# Altium footprint library pw.PcbLib: 210 footprints (part 9 of 14)
Each footprint in its own frame and in the unit in brackets; x right, y up, seen from the top. Pads: shape width x height; smd on the part's side, far side on the other; paste and mask are expansions set on the pad; w line width, h text height; cw(c..) or ccw(c..) is an arc to the next point about the centre after c.
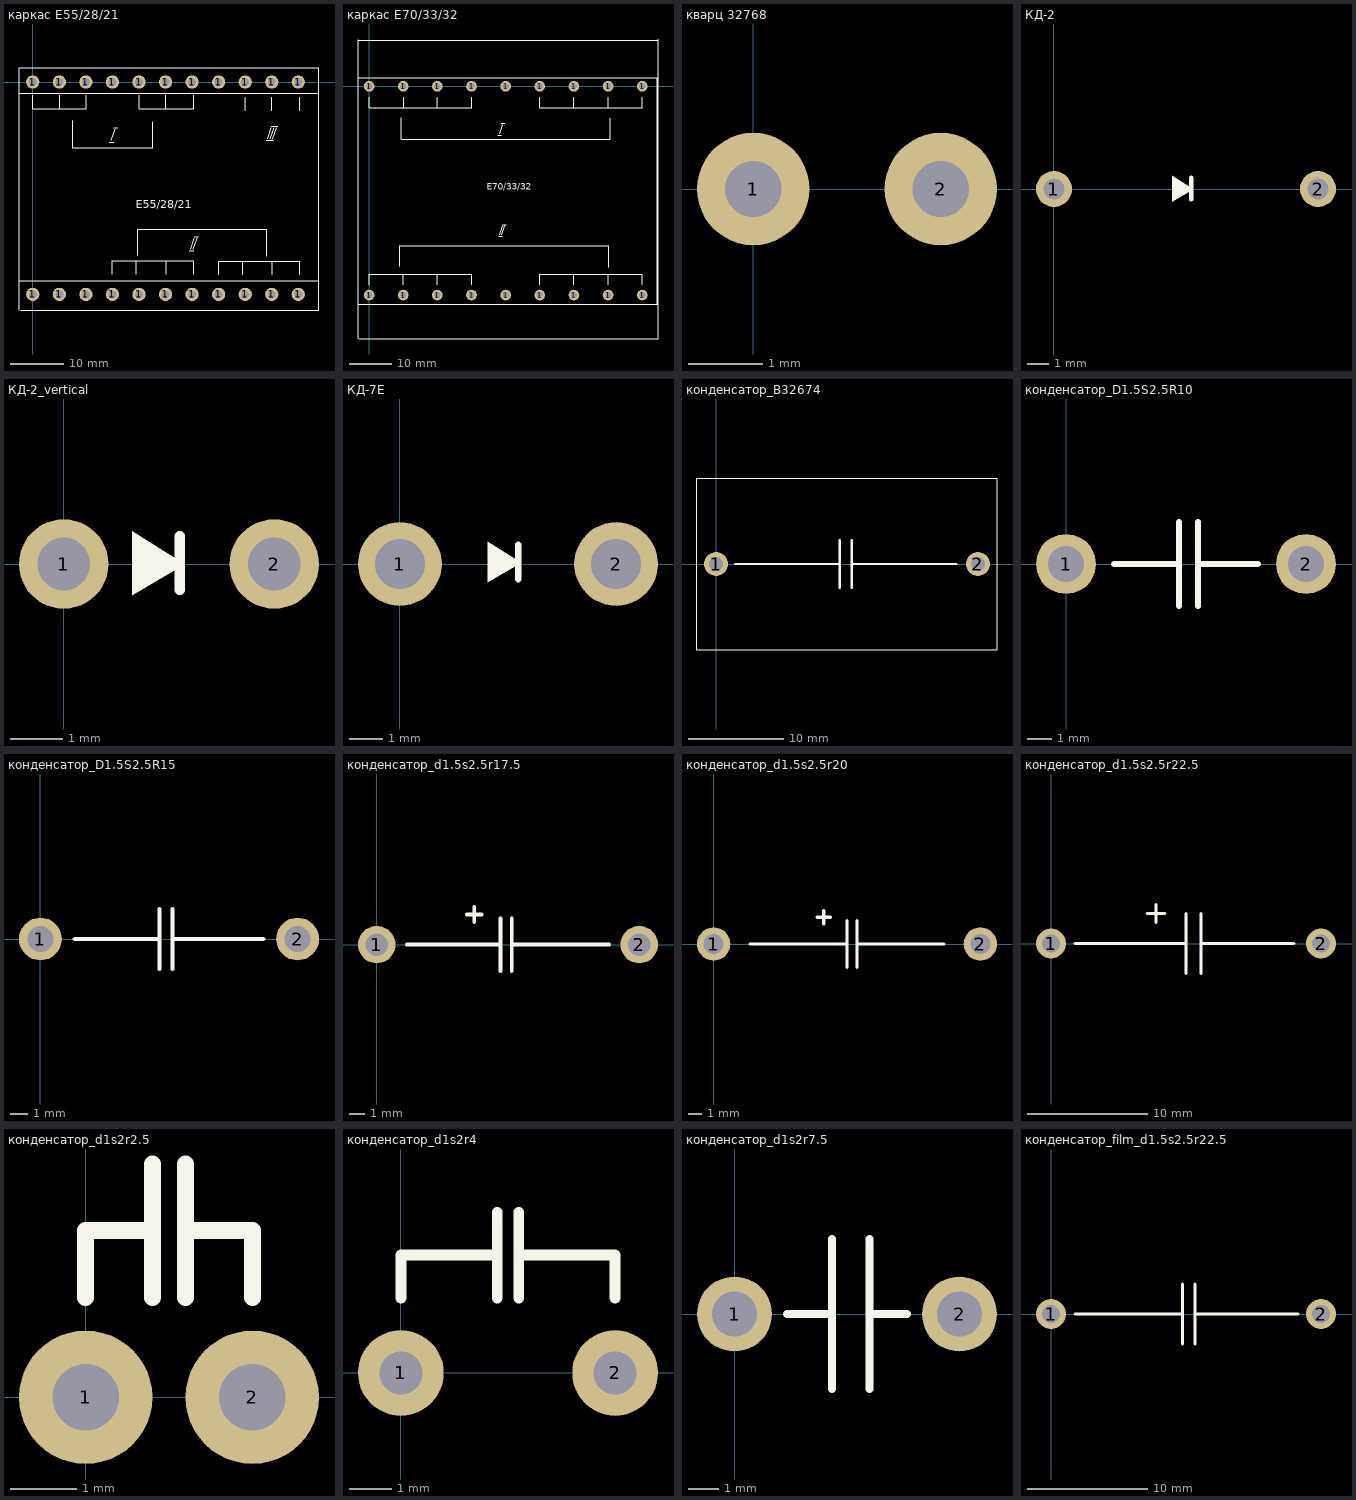
[diagram p8: the footprints below, top view; thin cyan lines are the x and y axes]

## каркас E55/28/21 [mm]
pads (22):
  round 2.5 hole 1.5: 1(0,-40) 1(0,0) 1(5,-40) 1(5,0) 1(10,-40) 1(10,0) 1(15,-40) 1(15,0) 1(20,-40) 1(20,0) 1(25,-40) 1(25,0) 1(30,-40) 1(30,0) 1(35,-40) 1(35,0) 1(40,-40) 1(40,0) 1(45,-40) 1(45,0) 1(50,-40) 1(50,0)
Top Overlay:
  lines w0.125: -2.5,-2.1 53.9,-2.1 ; 7.5,-7.3 7.5,-12.4 22.6,-12.4 22.6,-7.5 ; 15,-36.2 15,-33.7 ; 19.5,-36.2 19.5,-33.7 ; 19.8,-32.6 19.8,-27.7 44.1,-27.7 44.1,-32.8 ; 25.1,-36.2 25.1,-33.7 ; 30.3,-36.2 30.3,-33.7 ; 35,-36.3 35,-33.8 ; 39.5,-36.3 39.5,-33.8 ; 45.1,-36.3 45.1,-33.8 ; 50.3,-36.3 50.3,-33.8
  lines w0.2: -2.6,-43 -2.6,2.7 53.9,2.7 53.9,-43 -2.3,-43 ; -2.5,-37.4 53.7,-37.4 ; 0,-2.5 0,-5 10.1,-5 10.1,-2.5 ; 5,-5 5,-2.5 ; 14.4,-11.3 15.2,-11.3 ; 14.8,-11 15.5,-8.9 ; 15,-33.7 30.3,-33.7 ; 15.2,-8.6 16,-8.6 ; 20,-2.5 20,-5 30.3,-5 30.3,-2.5 ; 25,-5 25,-2.5 ; 29.5,-31.8 30.3,-31.8 ; 29.733,-31.5 30.433,-29.4 ; 30.233,-31.5 30.933,-29.4 ; 30.4,-29.1 31.2,-29.1 ; 35,-33.8 50.3,-33.8 ; 40,-5.4 40,-2.9 ; 44,-11 45.3,-11 ; 44.233,-10.7 44.933,-8.6 ; 44.733,-10.7 45.433,-8.6 ; 44.9,-8.3 46.1,-8.3 ; 45,-5.4 45,-2.9 ; 45.233,-10.7 45.933,-8.6 ; 50.3,-5.4 50.3,-2.9
  text "E55/28/21" at 19.4,-23.8 h1.52

## каркас E70/33/32 [mm]
pads (18):
  round 2.5 hole 1.5: 1(0,-48.9) 1(0,0) 1(8,-48.9) 1(8,0) 1(16,-48.9) 1(16,0) 1(24,-48.9) 1(24,0) 1(32,-48.9) 1(32,0) 1(40,-48.9) 1(40,0) 1(48,-48.9) 1(48,0) 1(56,-48.9) 1(56,0) 1(64,-48.9) 1(64,0)
Top Overlay:
  lines w0.125: 0,-46.5 0,-44 ; 7.2,-42.2 7.2,-37.3 56.2,-37.3 56.2,-42.4 ; 7.5,-7.3 7.5,-12.4 56.5,-12.4 56.5,-7.5 ; 8,-46.5 8,-44 ; 16,-46.5 16,-44 ; 24,-46.5 24,-44 ; 40,-46.5 40,-44 ; 48,-46.5 48,-44 ; 56,-46.5 56,-44 ; 64,-46.5 64,-44 ; -2.5,-51 -2.5,2 67.5,2 67.5,-50.5 67.5,-51 -2.5,-51
  lines w0.2: -2.6,-59.1 -2.6,10.9 ; -2.5,10.8 67.5,10.8 ; -2.3,-59.1 67.7,-59.1 ; 0,-44 24,-44 ; 0,-2.5 0,-5 24,-5 24,-2.5 ; 8,-5 8,-2.5 ; 16,-5 16,-2.5 ; 30.2,-11.4 31,-11.4 ; 30.4,-35.1 31.2,-35.1 ; 30.6,-11.1 31.3,-9 ; 30.633,-34.8 31.333,-32.7 ; 31,-8.7 31.8,-8.7 ; 31.133,-34.8 31.833,-32.7 ; 31.3,-32.4 32.1,-32.4 ; 40,-44 64,-44 ; 40,-2.5 40,-5 64,-5 64,-2.5 ; 48,-5 48,-2.5 ; 56,-5 56,-2.5 ; 67.7,-59 67.7,11
  text "E70/33/32" at 27.6,-24.2 h1.52

## кварц 32768 [mil]
pads (2):
  round 60 hole 30: 1(0,0) 2(100,0)
3D body "User Library-XTAL.STEP": height 112.99, standoff -41.34, extent -3.58,-326.77 105.94,3.19

## КД-2 [mm]
pads (2):
  round 1.7 hole 1: 1(0,0) 2(12.5,0)
Top Overlay:
  region: 5.6,0.619 5.6,-0.594 6.6,-0.006
  lines w0.2: 6.5,-0.494 6.5,0.531
3D body "User Library-DO-35-1.STEP": height 2.4, standoff -2.32, extent -0.325,-0.955 12.725,0.955

## КД-2_vertical [mm]
pads (2):
  round 1.7 hole 1: 1(0,0) 2(4,0)
Top Overlay:
  region: 1.3,0.619 1.3,-0.594 2.3,-0.006
  lines w0.2: 2.2,-0.494 2.2,0.531
3D body "User Library-DO-15-Vertical_100.STEP": height 11.05, standoff -4, extent -1.475,-1.7 3.275,1.86

## КД-7Е [mm]
height 100
pads (2):
  round 2.5 hole 1.5: 1(0,0) 2(6.455,0)
Top Overlay:
  region: 2.63,0.663 2.63,-0.55 3.63,0.038
  lines w0.2: 3.53,-0.45 3.53,0.575
3D body "User Library-User Library-DO-201AV-Vertical_2001.STEP": height 15.69, standoff -3, extent -2.8,-2.8 7.09,2.8

## конденсатор_B32674 [mm] "450v"
pads (2):
  round 2.5 hole 1.5: 1(0,0) 2(27.5,0)
Top Overlay:
  lines w0.125: -2,-9 29.5,-9 29.5,9 -2,9 -2,-9
  lines w0.254: 2,0 13,0 ; 13,-2.5 13,2.5 ; 14.25,-2.5 14.25,2.5 ; 14.25,0 25.25,0
3D body "User Library-Vishay_1uF-400V_MKT_373_STD_27_5pitch.STEP": height 23, standoff -3, extent -1.75,-6.5 29.25,6.5

## конденсатор_D1.5S2.5R10 [mm]
pads (2):
  round 2.5 hole 1.5: 1(0,0) 2(10,0)
Top Overlay:
  lines w0.254: 2,0 4.7,0 ; 4.7,-1.75 4.7,1.75 ; 5.5,-1.75 5.5,1.75 ; 5.6,0 8,0
3D body "User Library-capacitor 10mm pitch.STEP": height 12.5, standoff -4, extent -0.5,-2.4 10.5,2.6

## конденсатор_D1.5S2.5R15 [mm]
pads (2):
  round 2.5 hole 1.5: 1(0,0) 2(15,0)
Top Overlay:
  lines w0.254: 2,0 6.9,0 ; 6.95,-1.75 6.95,1.75 ; 7.7,-1.75 7.7,1.75 ; 7.8,0 13,0
3D body "User Library-CAP X2-9X17_5X18.STEP": height 17.5, standoff -2, extent -1.5,-4.4 16.5,4.6

## конденсатор_d1.5s2.5r17.5 [mm]
pads (2):
  round 2.5 hole 1.5: 1(0,0) 2(17.5,0)
Top Overlay:
  lines w0.254: 2,0 8.25,0 ; 6,2 7,2 ; 6.5,1.5 6.5,2.5 ; 8.25,-1.75 8.25,1.75 ; 9,-1.75 9,1.75 ; 9,0 15.5,0

## конденсатор_d1.5s2.5r20 [mm]
pads (2):
  round 2.5 hole 1.5: 1(0,0) 2(20,0)
Top Overlay:
  lines w0.254: 2.75,0 10,0 ; 7.75,2 8.75,2 ; 8.25,1.5 8.25,2.5 ; 10,-1.75 10,1.75 ; 10.75,-1.75 10.75,1.75 ; 10.75,0 17.25,0

## конденсатор_d1.5s2.5r22.5 [mm]
pads (2):
  round 2.5 hole 1.5: 1(0,0) 2(22.5,0)
Top Overlay:
  lines w0.254: 2,0 11.25,0 ; 8,2.5 9.5,2.5 ; 8.75,1.75 8.75,3.25 ; 11.25,-2.5 11.25,2.5 ; 12.5,-2.5 12.5,2.5 ; 12.5,0 20.25,0

## конденсатор_d1s2r2.5 [mm]
pads (2):
  round 2 hole 1: 1(0,0) 2(2.5,0)
Top Overlay:
  lines w0.254: 0,1.5 0,2.5 1,2.5 ; 1,1.5 1,3.5 ; 1.5,1.5 1.5,3.5 ; 1.5,2.5 2.5,2.5 2.5,1.5

## конденсатор_d1s2r4 [mm]
pads (2):
  round 2 hole 1: 1(0,0) 2(5,0)
Top Overlay:
  lines w0.254: 0,1.75 0,2.75 2.25,2.75 ; 2.25,1.75 2.25,3.75 ; 2.75,1.75 2.75,3.75 ; 2.75,2.75 5,2.75 5,1.75

## конденсатор_d1s2r7.5 [mm]
pads (2):
  round 2.5 hole 1.5: 1(0,0) 2(7.5,0)
Top Overlay:
  lines w0.254: 1.75,0 3.25,0 ; 3.25,-2.5 3.25,2.5 ; 4.5,-2.5 4.5,2.5 ; 4.5,0 5.75,0
3D body "User Library-CAP750 8_9x7x3_6.STEP": height 10, standoff -7, extent -0.7,-1.8 8.1,1.8

## конденсатор_film_d1.5s2.5r22.5 [mm]
pads (2):
  round 2.5 hole 1.5: 1(0,0) 2(22.5,0)
Top Overlay:
  lines w0.254: 2,0 10.8,0 ; 10.95,-2.5 10.95,2.5 ; 12,-2.5 12,2.5 ; 12.1,0 20.6,0
3D body "User Library-Film Capacitor 22_5x16x7mm.STEP": height 16, standoff -2, extent -2.05,-3.5 24.45,3.5